# Altium footprint library SG__PCB_HOLE_Connector.PcbLib: 154 footprints (part 2 of 10)
Each footprint in its own frame and in the unit in brackets; x right, y up, seen from the top. Pads: shape width x height; smd on the part's side, far side on the other; paste and mask are expansions set on the pad; w line width, h text height; cw(c..) or ccw(c..) is an arc to the next point about the centre after c.
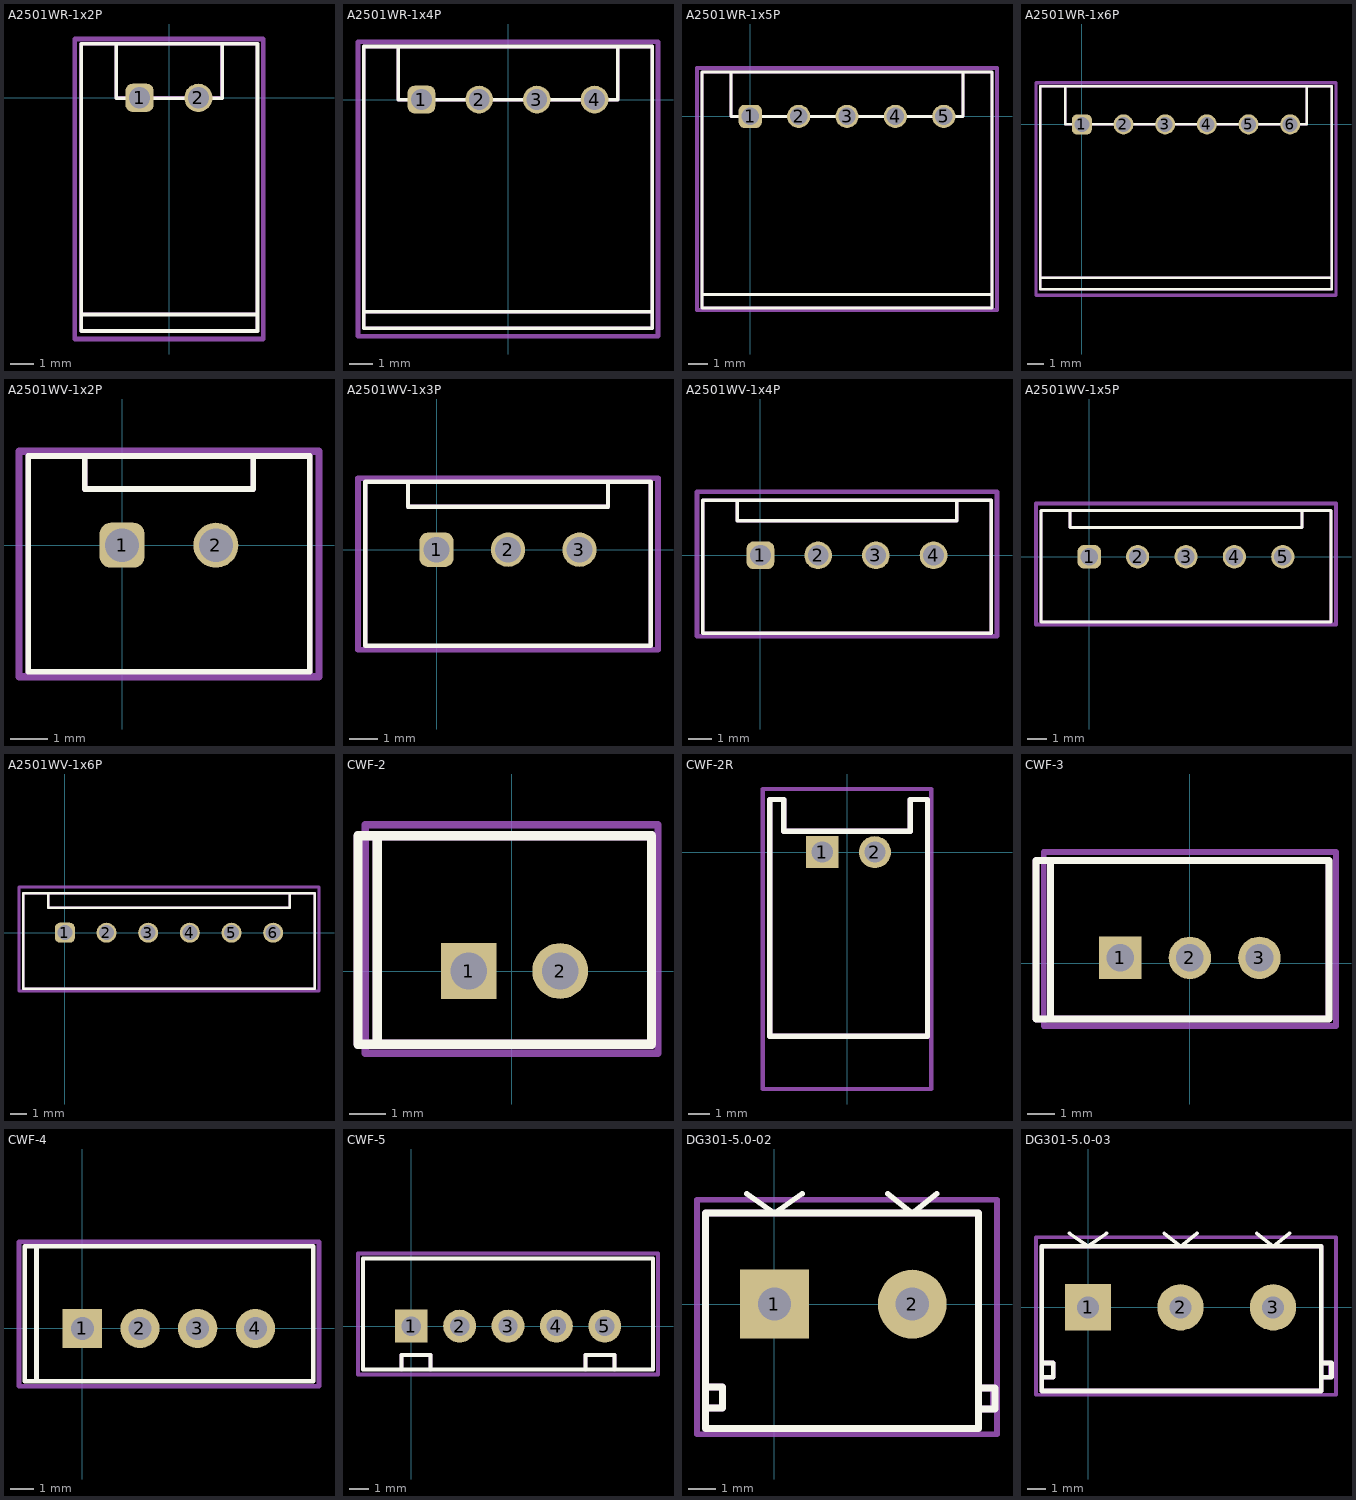
[diagram p1: the footprints below, top view; thin cyan lines are the x and y axes]

## A2501WR-1x2P [mm] "PLD-2-2.5"
pads (2):
  rrect50% 1.2x1.2 / inner rrect50% 1.5x1.5 / far side rrect50% 1.8x1.8 hole 0.9: 1(-1.25,0)
  round 1.2 / inner round 1.5 / far side round 1.8 hole 0.9: 2(1.25,0)
Top Overlay:
  lines w0.152: -3.738,-9.209 3.762,-9.209 ; -2.238,2.291 -2.238,-0.009 2.262,-0.009 2.262,2.291 ; -3.738,-9.909 3.762,-9.909 3.762,-1.009 3.762,2.291 -3.738,2.291 -3.738,0.491 -3.738,-9.909
Top Assembly:
  lines w0.152: -3.75,-9.2 3.75,-9.2 ; -2.25,2.3 -2.25,0 2.25,0 2.25,2.3 ; -3.75,-9.9 3.75,-9.9 3.75,-1 3.75,2.3 -3.75,2.3 -3.75,0.5 -3.75,-9.9
Top Courtyard:
  lines w0.2: -4,-10.25 4,-10.25 4,2.5 -4,2.5 -4,-10.25
3D body: height 5.75, standoff 0, extent -3.75,-9.9 3.75,2.3

## A2501WR-1x4P [mm] "PLD-2-2.5"
pads (4):
  rrect50% 1.2x1.2 / inner rrect50% 1.5x1.5 / far side rrect50% 1.8x1.8 hole 0.9: 1(-3.75,0)
  round 1.2 / inner round 1.5 / far side round 1.8 hole 0.9: 2(-1.25,0) 3(1.25,0) 4(3.75,0)
Top Overlay:
  lines w0.152: -6.25,-9.2 6.25,-9.2 ; -4.75,2.3 -4.75,0 4.75,0 4.75,2.3 ; -6.25,-9.9 -6.25,0.5 -6.25,2.3 6.25,2.3 6.25,-1 6.25,-9.9 -6.25,-9.9
Top Assembly:
  lines w0.152: -6.25,-9.2 6.25,-9.2 ; -4.75,2.3 -4.75,0 4.75,0 4.75,2.3 ; -6.25,-9.9 -6.25,0.5 -6.25,2.3 6.25,2.3 6.25,-1 6.25,-9.9 -6.25,-9.9
Top Courtyard:
  lines w0.2: -6.5,-10.25 -6.5,2.5 6.5,2.5 6.5,-10.25 -6.5,-10.25
3D body: height 5.75, standoff 0, extent -6.25,-9.9 6.25,2.3

## A2501WR-1x5P [mm] "PLD-2-2.5"
pads (5):
  rrect50% 1.2x1.2 / inner rrect50% 1.5x1.5 / far side rrect50% 1.8x1.8 hole 0.9: 1(0,0)
  round 1.2 / inner round 1.5 / far side round 1.8 hole 0.9: 2(2.5,0) 3(5,0) 4(7.5,0) 5(10,0)
Top Overlay:
  lines w0.152: -2.5,-9.2 12.5,-9.2 ; -1,2.3 -1,0 11,0 11,2.3 ; -2.5,-9.9 12.5,-9.9 12.5,-3.5 12.5,2.3 -2.5,2.3 -2.5,0.5 -2.5,-9.9
Top Assembly:
  lines w0.152: -2.5,-9.2 12.5,-9.2 ; -1,2.3 -1,0 11,0 11,2.3 ; -2.5,-9.9 -2.5,0.5 -2.5,2.3 12.5,2.3 12.5,-3.5 12.5,-9.9 -2.5,-9.9
Top Courtyard:
  lines w0.2: -2.75,-10 12.75,-10 12.75,2.5 -2.75,2.5 -2.75,-10
3D body: height 5.75, standoff 0, extent -2.5,-9.9 12.5,2.3

## A2501WR-1x6P [mm] "PLD-6-2.5"
pads (6):
  rrect50% 1.2x1.2 / inner rrect50% 1.5x1.5 / far side rrect50% 1.8x1.8 hole 0.9: 1(0,0)
  round 1.2 / inner round 1.5 / far side round 1.8 hole 0.9: 2(2.5,0) 3(5,0) 4(7.5,0) 5(10,0) 6(12.5,0)
Top Overlay:
  lines w0.152: -2.5,-9.2 15,-9.2 ; -1,2.3 -1,0 13.5,0 13.5,2.3 ; -2.5,-9.9 -2.5,0.5 -2.5,2.3 15,2.3 15,-6 15,-9.9 -2.5,-9.9
Top Assembly:
  lines w0.152: -2.5,-9.2 15,-9.2 ; -1,2.3 -1,0 13.5,0 13.5,2.3 ; -2.5,-9.9 15,-9.9 15,-6 15,2.3 -2.5,2.3 -2.5,0.5 -2.5,-9.9
Top Courtyard:
  lines w0.2: -2.75,-10.25 -2.75,2.5 15.25,2.5 15.25,-10.25 -2.75,-10.25
3D body: height 5.75, standoff 0, extent -2.5,-9.9 15,2.3

## A2501WV-1x2P [mm] "PLD-2-2.5"
pads (2):
  rrect50% 1.2x1.2 / inner rrect50% 1.5x1.5 / far side rrect50% 1.8x1.8 hole 0.9: 1(0,0)
  round 1.2 / inner round 1.5 / far side round 1.8 hole 0.9: 2(2.5,0)
Top Overlay:
  lines w0.152: -1,2.38 -1,1.5 3.5,1.5 3.5,2.3 ; -2.5,-3.37 -2.5,0.5 -2.5,2.38 5,2.38 5,-3.37 -2.5,-3.37
Top Assembly:
  lines w0.152: -1,2.38 -1,1.5 3.5,1.5 3.5,2.3 ; -2.5,-3.37 -2.5,0.5 -2.5,2.38 5,2.38 5,-3.37 -2.5,-3.37
Top Courtyard:
  lines w0.2: -2.75,-3.5 -2.75,2.5 5.25,2.5 5.25,-3.5 -2.75,-3.5
3D body: height 7, standoff 0, extent -2.5,-3.37 5,2.38

## A2501WV-1x3P [mm] "PLD-2-2.5"
pads (3):
  rrect50% 1.2x1.2 / inner rrect50% 1.5x1.5 / far side rrect50% 1.8x1.8 hole 0.9: 1(0,0)
  round 1.2 / inner round 1.5 / far side round 1.8 hole 0.9: 2(2.5,0) 3(5,0)
Top Overlay:
  lines w0.152: -1,2.383 -1,1.503 6,1.503 6,2.303 ; -2.5,-3.367 -2.5,0.503 -2.5,2.383 7.5,2.383 7.5,0.503 7.5,-3.367 -2.5,-3.367
Top Assembly:
  lines w0.152: -1,2.38 -1,1.5 6,1.5 6,2.3 ; -2.5,-3.37 7.5,-3.37 7.5,0.5 7.5,2.38 -2.5,2.38 -2.5,0.5 -2.5,-3.37
Top Courtyard:
  lines w0.2: -2.75,-3.5 -2.75,2.5 7.75,2.5 7.75,-3.5 -2.75,-3.5
3D body: height 7, standoff 0, extent -2.5,-3.37 7.5,2.38

## A2501WV-1x4P [mm] "PLD-2-2.5"
pads (4):
  rrect50% 1.2x1.2 / inner rrect50% 1.5x1.5 / far side rrect50% 1.8x1.8 hole 0.9: 1(0,0)
  round 1.2 / inner round 1.5 / far side round 1.8 hole 0.9: 2(2.5,0) 3(5,0) 4(7.5,0)
Top Overlay:
  lines w0.152: -1,2.38 -1,1.5 8.5,1.5 8.5,2.3 ; -2.5,-3.37 10,-3.37 10,-2 10,2.38 -2.5,2.38 -2.5,0.5 -2.5,-3.37
Top Assembly:
  lines w0.152: -1,2.38 -1,1.5 8.5,1.5 8.5,2.3 ; -2.5,-3.37 10,-3.37 10,-2 10,2.38 -2.5,2.38 -2.5,0.5 -2.5,-3.37
Top Courtyard:
  lines w0.2: -2.75,-3.5 -2.75,2.75 10.25,2.75 10.25,-3.5 -2.75,-3.5
3D body: height 7, standoff 0, extent -2.5,-3.37 10,2.38

## A2501WV-1x5P [mm] "PLD-2-2.5"
pads (5):
  rrect50% 1.2x1.2 / inner rrect50% 1.5x1.5 / far side rrect50% 1.8x1.8 hole 0.9: 1(0,0)
  round 1.2 / inner round 1.5 / far side round 1.8 hole 0.9: 2(2.5,0) 3(5,0) 4(7.5,0) 5(10,0)
Top Overlay:
  lines w0.152: -1,2.38 -1,1.5 11,1.5 11,2.3 ; -2.5,-3.37 12.5,-3.37 12.5,0.5 12.5,2.38 -2.5,2.38 -2.5,0.5 -2.5,-3.37
Top Assembly:
  lines w0.152: -1,2.38 -1,1.5 11,1.5 11,2.3 ; -2.5,-3.37 12.5,-3.37 12.5,0.5 12.5,2.38 -2.5,2.38 -2.5,0.5 -2.5,-3.37
Top Courtyard:
  lines w0.2: -2.75,-3.5 -2.75,2.75 12.75,2.75 12.75,-3.5 -2.75,-3.5
3D body: height 7, standoff 0, extent -2.5,-3.37 12.5,2.38

## A2501WV-1x6P [mm] "PLD-6-2.5"
pads (6):
  rrect50% 1.2x1.2 / inner rrect50% 1.5x1.5 / far side rrect50% 1.8x1.8 hole 0.9: 1(0,0)
  round 1.2 / inner round 1.5 / far side round 1.8 hole 0.9: 2(2.5,0) 3(5,0) 4(7.5,0) 5(10,0) 6(12.5,0)
Top Overlay:
  lines w0.152: -1,2.38 -1,1.5 13.5,1.5 13.5,2.3 ; -2.5,-3.37 15,-3.37 15,1 15,2.38 -2.5,2.38 -2.5,0.5 -2.5,-3.37
Top Assembly:
  lines w0.152: -1,2.38 -1,1.5 13.5,1.5 13.5,2.3 ; -2.5,-3.37 15,-3.37 15,1 15,2.38 -2.5,2.38 -2.5,0.5 -2.5,-3.37
Top Courtyard:
  lines w0.2: -2.75,-3.5 -2.75,2.75 15.25,2.75 15.25,-3.5 -2.75,-3.5
3D body: height 7, standoff 0, extent -2.5,-3.37 15,2.38

## CWF-2 [mm]
pads (2):
  rect 1.524x1.524 hole 1: 1(-1.175,0)
  round 1.524 hole 1: 2(1.325,0)
Top Overlay:
  lines w0.254: -3.675,-2 3.825,-2 3.825,3.7 -3.675,3.7 ; -3.675,-2 -3.675,3.7 ; -3.675,-2 -4.2,-2 -4.2,3.7 -3.675,3.7
Top Assembly:
  lines w0.254: -3.675,-2 -3.675,3.7 ; -3.675,-2 -4.2,-2 -4.2,3.7 -3.675,3.7 ; -3.675,-2 3.825,-2 3.825,3.7 -3.675,3.7
Top Courtyard:
  lines w0.2: -4,-2.25 -4,4 4,4 4,-2.25 -4,-2.25
3D body "CWF2.stp": height 7.7, standoff -1.5, extent -3.675,-2.1 3.825,3.6

## CWF-2R [mm]
pads (2):
  rect 1.524x1.524 hole 1: 1(-1.175,0)
  round 1.524 hole 1: 2(1.325,0)
Top Overlay:
  lines w0.254: -3.675,-8.75 3.825,-8.75 ; -3.675,-8.75 -3.675,2.5 ; -3.675,-8.75 3.825,-8.75 ; -3.675,-8.75 -3.675,2.5 ; -3.675,2.5 -3,2.5 ; -3.675,2.5 -3,2.5 ; -3,1 -3,2.5 ; -3,1 3,1 ; -3,1 3,1 ; -3,1 -3,2.5 ; 3,1 3,2.5 ; 3,1 3,2.5 ; 3,2.5 3.825,2.5 ; 3,2.5 3.825,2.5 ; 3.825,-8.75 3.825,2.5 ; 3.825,-8.75 3.825,2.5
Top Assembly:
  lines w0.254: -3.675,-8.75 -3.675,2.5 ; -3.675,-8.75 -3.675,2.5 ; -3.675,-8.75 3.825,-8.75 ; -3.675,-8.75 3.825,-8.75 ; -3.675,2.5 -3,2.5 ; -3.675,2.5 -3,2.5 ; -3,1 -3,2.5 ; -3,1 -3,2.5 ; -3,1 3,1 ; -3,1 3,1 ; 3,1 3,2.5 ; 3,1 3,2.5 ; 3,2.5 3.825,2.5 ; 3,2.5 3.825,2.5 ; 3.825,-8.75 3.825,2.5 ; 3.825,-8.75 3.825,2.5
Top Courtyard:
  lines w0.2: -4,-11.25 -4,3 4,3 4,-11.25 -4,-11.25
3D body "User Library-DS1069-2 CWF-2R.step": height 5.75, standoff -3.5, extent -3.675,-8.88 3.825,2.62
3D body "User Library-User Library-DS1069F.step": height 4.6, standoff -0.5, extent -3.275,-11.25 3.425,-3.55

## CWF-3 [mm]
pads (3):
  rect 1.524x1.524 hole 1: 1(-2.5,0.2)
  round 1.524 hole 1: 2(0,0.2) 3(2.5,0.2)
Top Overlay:
  lines w0.254: -5,-2 5,-2 5,3.7 -5,3.7 ; -5,-2 -5,3.7 ; -5,-2 -5.525,-2 -5.525,3.7 -5,3.7
Top Assembly:
  lines w0.254: -5,-2 5,-2 5,3.7 -5,3.7 ; -5,-2 -5.525,-2 -5.525,3.7 -5,3.7 ; -5,-2 -5,3.7
Top Courtyard:
  lines w0.2: -5.25,-2.25 -5.25,4 5.25,4 5.25,-2.25 -5.25,-2.25
3D body "CWF3.stp": height 7.7, standoff -1.5, extent -4.9,-2.05 5.1,3.65

## CWF-4 [mm]
pads (4):
  rect 1.7x1.7 hole 1 mask+0.05: 1(-0.007,0)
  round 1.7 hole 1 mask+0.05: 2(2.493,0) 3(4.993,0) 4(7.493,0)
Top Overlay:
  lines w0.2: -1.991,-2.265 -1.991,3.556 ; -2.507,-2.286 -2.507,3.556 9.993,3.556 9.993,-2.286 -2.507,-2.286
Top Assembly:
  lines w0.15: -2.507,-2.286 -2.507,3.556 9.993,3.556 9.993,-2.286 -2.507,-2.286
Top Courtyard:
  lines w0.2: -2.75,-2.5 -2.75,3.75 10.25,3.75 10.25,-2.5 -2.75,-2.5
3D body "CWF-4.step": height 7.1, standoff -3.4, extent -2.39,-2.194 10.01,3.556

## CWF-5 [mm]
pads (5):
  rect 1.7x1.7 hole 1 mask+0.05: 1(0,0)
  round 1.7 hole 1 mask+0.05: 2(2.5,0) 3(5,0) 4(7.5,0) 5(10,0)
Top Overlay:
  lines w0.2: -0.5,-2.25 -0.5,-1.5 1,-1.5 1,-2.25 ; 8.995,-2.25 8.995,-1.5 10.5,-1.5 10.5,-2.25 ; -2.5,-2.25 12.5,-2.25 12.5,3.5 -2.5,3.5 -2.5,-2.25
Top Assembly:
  lines w0.15: -2.5,-2.25 12.5,-2.25 12.5,3.5 -2.5,3.5 -2.5,-2.25
  lines w0.2: -0.5,-2.25 -0.5,-1.5 1,-1.5 1,-2.25 ; 8.995,-2.25 8.995,-1.5 10.5,-1.5 10.5,-2.25
Top Courtyard:
  lines w0.2: -2.75,-2.5 -2.75,3.75 12.75,3.75 12.75,-2.5 -2.75,-2.5
3D body "CWF-5.step": height 7.2, standoff -3.3, extent -2.5,-2.25 12.5,3.5

## DG301-5.0-02 [mm] "PCB terminals 5mm"
pads (2):
  rect 2.5x2.5 hole 1.2: 1(0,0)
  round 2.5 hole 1.2: 2(5,0)
Top Overlay:
  lines w0.2: -1,4 0,3.3 1,4 ; 4.116,4 5,3.3 5.884,4
  lines w0.254: -2.392,-3.772 -1.884,-3.772 -1.884,-3.01 -2.392,-3.01 ; 7.492,-3.8 8,-3.8 8,-3.038 7.492,-3.038 ; -2.5,-4.52 -2.5,3.3 7.4,3.3 7.4,-4.52 -2.5,-4.52
Top Assembly:
  lines w0.254: -2.392,-3.772 -1.884,-3.772 -1.884,-3.01 -2.392,-3.01 ; 7.446,-3.8 7.954,-3.8 7.954,-3.038 7.446,-3.038 ; -2.5,-4.52 -2.5,3.3 7.4,3.3 7.4,-4.52 -2.5,-4.52
Top Courtyard:
  lines w0.2: -2.812,-4.716 -2.812,3.784 8.076,3.784 8.076,-4.716 -2.812,-4.716
3D body "DG301-5.0-02P-1Y-00A(H).stp": height 10.4, standoff -3.9, extent -2.524,-4.52 8.076,3.08

## DG301-5.0-03 [mm] "PCB terminals 5mm"
pads (3):
  rect 2.5x2.5 hole 1.2: 1(0,0)
  round 2.5 hole 1.2: 2(5,0) 3(10,0)
Top Overlay:
  lines w0.2: -1,4 0,3.3 1,4 ; 4.116,4 5,3.3 5.884,4 ; 9.116,4 10,3.3 10.884,4
  lines w0.254: -2.392,-3.772 -1.884,-3.772 -1.884,-3.01 -2.392,-3.01 ; 12.646,-3.772 13.154,-3.772 13.154,-3.01 12.646,-3.01 ; -2.5,-4.52 12.6,-4.52 12.6,3.3 -2.5,3.3 -2.5,-4.52
Top Assembly:
  lines w0.254: -2.392,-3.772 -1.884,-3.772 -1.884,-3.01 -2.392,-3.01 ; 12.6,-3.772 13.108,-3.772 13.108,-3.01 12.6,-3.01 ; -2.5,-4.52 12.6,-4.52 12.6,3.3 -2.5,3.3 -2.5,-4.52
Top Courtyard:
  lines w0.2: -2.812,-4.716 13.4,-4.716 13.4,3.784 -2.812,3.784 -2.812,-4.716
3D body "DG301-5.0-03P-1Y-00A(H).stp": height 10.4, standoff -3.9, extent -2.4,-4.3 13.2,3.3